# Altium schematic symbol library jlcpcb_2025_04_resistors_extended_0201.schlib: 1508 symbols (part 1 of 8)
Pins are listed as number, name and electrical type; pins without a type are passive.

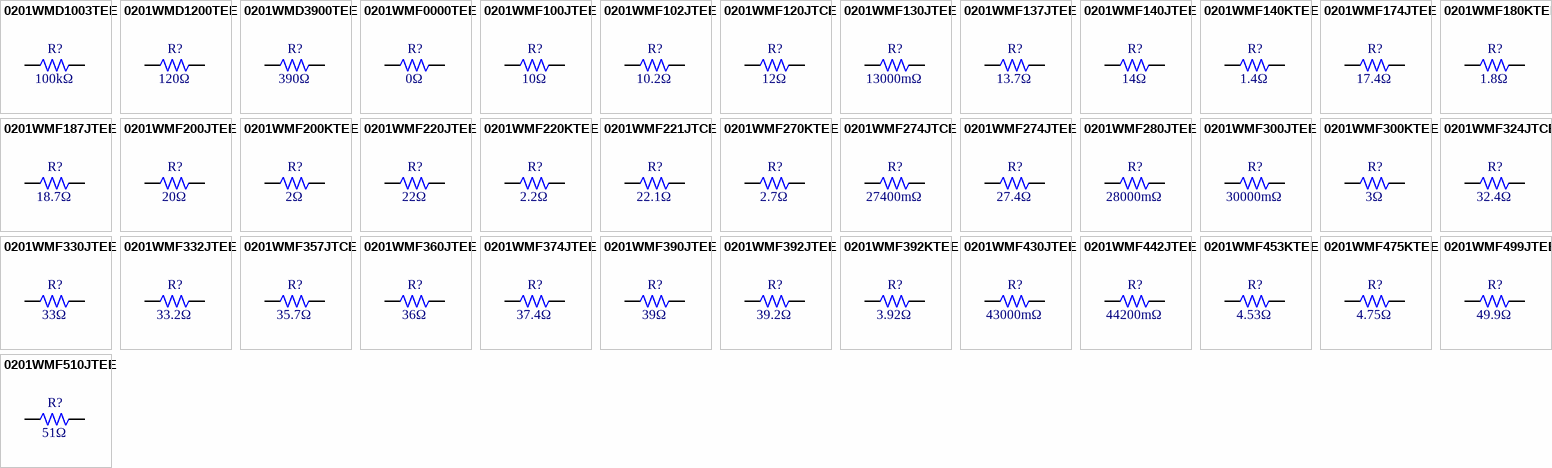
[diagram p0: symbols 0201WMD1003TEE to 0201WMF510JTEE]

## 0201WMD1003TEE
designator R?  Resistance: 100kΩ  (hidden comment: *)
Resistor, 100kΩ, ±0.5%, 50mW, 25V, -55℃~+155℃, SMD 0201; Manufacturer: Uniroyal; Manufacturer Part Number: 0201WMD1003TEE; Supplier 1: LCSC; Supplier Part Number 1: C778396; JLCPCB Part Number: C778396; Power Rating: 50mW; Category: Resistors; Package Size: 0201; JLCPCB Basic Part: Yes; Tolerance: ±0.5%; Voltage Rating: 25V; Temperature Rating: -55℃~+155℃; ComponentLink1Description: Datasheet; ComponentLink1URL: https://wmsc.lcsc.com/wmsc/upload/file/pdf/v2/lcsc/2205312045_UNI-ROYAL-Uniroyal-Elec-0201WMD1003TEE_C778396.pdf; ComponentLink2Description: JLCPCB Part URL; ComponentLink2URL: https://jlcpcb.com/partdetail/C778396
pins: 1, 2
1 alternate drawing of the same symbol

## 0201WMD1200TEE
designator R?  Resistance: 120Ω  (hidden comment: *)
Resistor, 120Ω, ±0.5%, 50mW, 25V, ±200ppm/℃, -55℃~+155℃, SMD 0201; Manufacturer: Uniroyal; Manufacturer Part Number: 0201WMD1200TEE; Supplier 1: LCSC; Supplier Part Number 1: C474180; JLCPCB Part Number: C474180; Power Rating: 50mW; Category: Resistors; Package Size: 0201; JLCPCB Basic Part: Yes; Tolerance: ±0.5%; Voltage Rating: 25V; Temperature Coefficient: ±200ppm/℃; Temperature Rating: -55℃~+155℃; ComponentLink1Description: Datasheet; ComponentLink1URL: https://wmsc.lcsc.com/wmsc/upload/file/pdf/v2/lcsc/2205312045_UNI-ROYAL-Uniroyal-Elec-0201WMD1200TEE_C474180.pdf; ComponentLink2Description: JLCPCB Part URL; ComponentLink2URL: https://jlcpcb.com/partdetail/C474180
pins: 1, 2
1 alternate drawing of the same symbol

## 0201WMD3900TEE
designator R?  Resistance: 390Ω  (hidden comment: *)
Resistor, 390Ω, ±0.5%, 50mW, 25V, ±200ppm/℃, -55℃~+155℃, SMD 0201; Manufacturer: Uniroyal; Manufacturer Part Number: 0201WMD3900TEE; Supplier 1: LCSC; Supplier Part Number 1: C473926; JLCPCB Part Number: C473926; Power Rating: 50mW; Category: Resistors; Package Size: 0201; JLCPCB Basic Part: Yes; Tolerance: ±0.5%; Voltage Rating: 25V; Temperature Coefficient: ±200ppm/℃; Temperature Rating: -55℃~+155℃; ComponentLink1Description: Datasheet; ComponentLink1URL: https://wmsc.lcsc.com/wmsc/upload/file/pdf/v2/lcsc/2205312130_UNI-ROYAL-Uniroyal-Elec-0201WMD3900TEE_C473926.pdf; ComponentLink2Description: JLCPCB Part URL; ComponentLink2URL: https://jlcpcb.com/partdetail/C473926
pins: 1, 2
1 alternate drawing of the same symbol

## 0201WMF0000TEE
designator R?  Resistance: 0Ω  (hidden comment: *)
Resistor, 0Ω, ±1%, 50mW, 25V, -55℃~+155℃, SMD 0201; Manufacturer: Uniroyal; Manufacturer Part Number: 0201WMF0000TEE; Supplier 1: LCSC; Supplier Part Number 1: C473473; JLCPCB Part Number: C473473; Power Rating: 50mW; Category: Resistors; Package Size: 0201; JLCPCB Basic Part: Yes; Tolerance: ±1%; Voltage Rating: 25V; Temperature Rating: -55℃~+155℃; ComponentLink1Description: Datasheet; ComponentLink1URL: https://wmsc.lcsc.com/wmsc/upload/file/pdf/v2/lcsc/2205312145_UNI-ROYAL-Uniroyal-Elec-0201WMF0000TEE_C473473.pdf; ComponentLink2Description: JLCPCB Part URL; ComponentLink2URL: https://jlcpcb.com/partdetail/C473473
pins: 1, 2
1 alternate drawing of the same symbol

## 0201WMF100JTEE
designator R?  Resistance: 10Ω  (hidden comment: *)
Resistor, 10Ω, ±1%, 50mW, 25V, ±200ppm/℃, -55℃~+155℃, SMD 0201; Manufacturer: Uniroyal; Manufacturer Part Number: 0201WMF100JTEE; Supplier 1: LCSC; Supplier Part Number 1: C270817; JLCPCB Part Number: C270817; Power Rating: 50mW; Category: Resistors; Package Size: 0201; JLCPCB Basic Part: Yes; Tolerance: ±1%; Voltage Rating: 25V; Temperature Coefficient: ±200ppm/℃; Temperature Rating: -55℃~+155℃; ComponentLink1Description: Datasheet; ComponentLink1URL: https://wmsc.lcsc.com/wmsc/upload/file/pdf/v2/lcsc/2205312300_UNI-ROYAL-Uniroyal-Elec-0201WMF100JTEE_C270817.pdf; ComponentLink2Description: JLCPCB Part URL; ComponentLink2URL: https://jlcpcb.com/partdetail/C270817
pins: 1, 2
1 alternate drawing of the same symbol

## 0201WMF102JTEE
designator R?  Resistance: 10.2Ω  (hidden comment: *)
Resistor, 10.2Ω, ±1%, 50mW, 25V, ±200ppm/℃, -55℃~+155℃, SMD 0201; Manufacturer: Uniroyal; Manufacturer Part Number: 0201WMF102JTEE; Supplier 1: LCSC; Supplier Part Number 1: C423792; JLCPCB Part Number: C423792; Power Rating: 50mW; Category: Resistors; Package Size: 0201; JLCPCB Basic Part: Yes; Tolerance: ±1%; Voltage Rating: 25V; Temperature Coefficient: ±200ppm/℃; Temperature Rating: -55℃~+155℃; ComponentLink1Description: Datasheet; ComponentLink1URL: https://wmsc.lcsc.com/wmsc/upload/file/pdf/v2/lcsc/2205312145_UNI-ROYAL-Uniroyal-Elec-0201WMF102JTEE_C423792.pdf; ComponentLink2Description: JLCPCB Part URL; ComponentLink2URL: https://jlcpcb.com/partdetail/C423792
pins: 1, 2
1 alternate drawing of the same symbol

## 0201WMF120JTCE
designator R?  Resistance: 12Ω  (hidden comment: *)
Resistor, 12Ω, ±1%, 50mW, 25V, ±200ppm/℃, -55℃~+155℃, SMD 0201; Manufacturer: Uniroyal; Manufacturer Part Number: 0201WMF120JTCE; Supplier 1: LCSC; Supplier Part Number 1: C270807; JLCPCB Part Number: C270807; Power Rating: 50mW; Category: Resistors; Package Size: 0201; JLCPCB Basic Part: Yes; Tolerance: ±1%; Voltage Rating: 25V; Temperature Coefficient: ±200ppm/℃; Temperature Rating: -55℃~+155℃; ComponentLink1Description: Datasheet; ComponentLink1URL: https://wmsc.lcsc.com/wmsc/upload/file/pdf/v2/lcsc/2205312300_UNI-ROYAL-Uniroyal-Elec-0201WMF120JTCE_C270807.pdf; ComponentLink2Description: JLCPCB Part URL; ComponentLink2URL: https://jlcpcb.com/partdetail/C270807
pins: 1, 2
1 alternate drawing of the same symbol

## 0201WMF130JTEE
designator R?  Resistance: 13000mΩ  (hidden comment: *)
Resistor, 13000mΩ, ±1%, 50mW, 25V, ±200ppm/℃, -55℃~+155℃, SMD 0201; Manufacturer: Uniroyal; Manufacturer Part Number: 0201WMF130JTEE; Supplier 1: LCSC; Supplier Part Number 1: C423752; JLCPCB Part Number: C423752; Power Rating: 50mW; Category: Resistors; Package Size: 0201; JLCPCB Basic Part: Yes; Tolerance: ±1%; Voltage Rating: 25V; Temperature Coefficient: ±200ppm/℃; Temperature Rating: -55℃~+155℃; ComponentLink1Description: Datasheet; ComponentLink1URL: https://wmsc.lcsc.com/wmsc/upload/file/pdf/v2/lcsc/2205312145_UNI-ROYAL-Uniroyal-Elec-0201WMF130JTEE_C423752.pdf; ComponentLink2Description: JLCPCB Part URL; ComponentLink2URL: https://jlcpcb.com/partdetail/C423752
pins: 1, 2
1 alternate drawing of the same symbol

## 0201WMF137JTEE
designator R?  Resistance: 13.7Ω  (hidden comment: *)
Resistor, 13.7Ω, ±1%, 50mW, 25V, ±200ppm/℃, -55℃~+155℃, SMD 0201; Manufacturer: Uniroyal; Manufacturer Part Number: 0201WMF137JTEE; Supplier 1: LCSC; Supplier Part Number 1: C423742; JLCPCB Part Number: C423742; Power Rating: 50mW; Category: Resistors; Package Size: 0201; JLCPCB Basic Part: Yes; Tolerance: ±1%; Voltage Rating: 25V; Temperature Coefficient: ±200ppm/℃; Temperature Rating: -55℃~+155℃; ComponentLink1Description: Datasheet; ComponentLink1URL: https://wmsc.lcsc.com/wmsc/upload/file/pdf/v2/lcsc/2205312145_UNI-ROYAL-Uniroyal-Elec-0201WMF137JTEE_C423742.pdf; ComponentLink2Description: JLCPCB Part URL; ComponentLink2URL: https://jlcpcb.com/partdetail/C423742
pins: 1, 2
1 alternate drawing of the same symbol

## 0201WMF140JTEE
designator R?  Resistance: 14Ω  (hidden comment: *)
Resistor, 14Ω, ±1%, 50mW, 25V, ±200ppm/℃, -55℃~+155℃, SMD 0201; Manufacturer: Uniroyal; Manufacturer Part Number: 0201WMF140JTEE; Supplier 1: LCSC; Supplier Part Number 1: C423736; JLCPCB Part Number: C423736; Power Rating: 50mW; Category: Resistors; Package Size: 0201; JLCPCB Basic Part: Yes; Tolerance: ±1%; Voltage Rating: 25V; Temperature Coefficient: ±200ppm/℃; Temperature Rating: -55℃~+155℃; ComponentLink1Description: Datasheet; ComponentLink1URL: https://wmsc.lcsc.com/wmsc/upload/file/pdf/v2/lcsc/2205312145_UNI-ROYAL-Uniroyal-Elec-0201WMF140JTEE_C423736.pdf; ComponentLink2Description: JLCPCB Part URL; ComponentLink2URL: https://jlcpcb.com/partdetail/C423736
pins: 1, 2
1 alternate drawing of the same symbol

## 0201WMF140KTEE
designator R?  Resistance: 1.4Ω  (hidden comment: *)
Resistor, 1.4Ω, ±1%, 50mW, 25V, -100ppm/℃~+350ppm/℃, -55℃~+155℃, SMD 0201; Manufacturer: Uniroyal; Manufacturer Part Number: 0201WMF140KTEE; Supplier 1: LCSC; Supplier Part Number 1: C423735; JLCPCB Part Number: C423735; Power Rating: 50mW; Category: Resistors; Package Size: 0201; JLCPCB Basic Part: Yes; Tolerance: ±1%; Voltage Rating: 25V; Temperature Coefficient: -100ppm/℃~+350ppm/℃; Temperature Rating: -55℃~+155℃; ComponentLink1Description: Datasheet; ComponentLink1URL: https://wmsc.lcsc.com/wmsc/upload/file/pdf/v2/lcsc/2205312145_UNI-ROYAL-Uniroyal-Elec-0201WMF140KTEE_C423735.pdf; ComponentLink2Description: JLCPCB Part URL; ComponentLink2URL: https://jlcpcb.com/partdetail/C423735
pins: 1, 2
1 alternate drawing of the same symbol

## 0201WMF174JTEE
designator R?  Resistance: 17.4Ω  (hidden comment: *)
Resistor, 17.4Ω, ±1%, 50mW, 25V, ±200ppm/℃, -55℃~+155℃, SMD 0201; Manufacturer: Uniroyal; Manufacturer Part Number: 0201WMF174JTEE; Supplier 1: LCSC; Supplier Part Number 1: C423694; JLCPCB Part Number: C423694; Power Rating: 50mW; Category: Resistors; Package Size: 0201; JLCPCB Basic Part: Yes; Tolerance: ±1%; Voltage Rating: 25V; Temperature Coefficient: ±200ppm/℃; Temperature Rating: -55℃~+155℃; ComponentLink1Description: Datasheet; ComponentLink1URL: https://wmsc.lcsc.com/wmsc/upload/file/pdf/v2/lcsc/2205312030_UNI-ROYAL-Uniroyal-Elec-0201WMF174JTEE_C423694.pdf; ComponentLink2Description: JLCPCB Part URL; ComponentLink2URL: https://jlcpcb.com/partdetail/C423694
pins: 1, 2
1 alternate drawing of the same symbol

## 0201WMF180KTEE
designator R?  Resistance: 1.8Ω  (hidden comment: *)
Resistor, 1.8Ω, ±1%, 50mW, 25V, -100ppm/℃~+350ppm/℃, -55℃~+155℃, SMD 0201; Manufacturer: Uniroyal; Manufacturer Part Number: 0201WMF180KTEE; Supplier 1: LCSC; Supplier Part Number 1: C473582; JLCPCB Part Number: C473582; Power Rating: 50mW; Category: Resistors; Package Size: 0201; JLCPCB Basic Part: Yes; Tolerance: ±1%; Voltage Rating: 25V; Temperature Coefficient: -100ppm/℃~+350ppm/℃; Temperature Rating: -55℃~+155℃; ComponentLink1Description: Datasheet; ComponentLink1URL: https://wmsc.lcsc.com/wmsc/upload/file/pdf/v2/lcsc/2205312145_UNI-ROYAL-Uniroyal-Elec-0201WMF180KTEE_C473582.pdf; ComponentLink2Description: JLCPCB Part URL; ComponentLink2URL: https://jlcpcb.com/partdetail/C473582
pins: 1, 2
1 alternate drawing of the same symbol

## 0201WMF187JTEE
designator R?  Resistance: 18.7Ω  (hidden comment: *)
Resistor, 18.7Ω, ±1%, 50mW, 25V, ±200ppm/℃, -55℃~+155℃, SMD 0201; Manufacturer: Uniroyal; Manufacturer Part Number: 0201WMF187JTEE; Supplier 1: LCSC; Supplier Part Number 1: C423680; JLCPCB Part Number: C423680; Power Rating: 50mW; Category: Resistors; Package Size: 0201; JLCPCB Basic Part: Yes; Tolerance: ±1%; Voltage Rating: 25V; Temperature Coefficient: ±200ppm/℃; Temperature Rating: -55℃~+155℃; ComponentLink1Description: Datasheet; ComponentLink1URL: https://wmsc.lcsc.com/wmsc/upload/file/pdf/v2/lcsc/2205312145_UNI-ROYAL-Uniroyal-Elec-0201WMF187JTEE_C423680.pdf; ComponentLink2Description: JLCPCB Part URL; ComponentLink2URL: https://jlcpcb.com/partdetail/C423680
pins: 1, 2
1 alternate drawing of the same symbol

## 0201WMF200JTEE
designator R?  Resistance: 20Ω  (hidden comment: *)
Resistor, 20Ω, ±1%, 50mW, 25V, ±200ppm/℃, -55℃~+155℃, SMD 0201; Manufacturer: Uniroyal; Manufacturer Part Number: 0201WMF200JTEE; Supplier 1: LCSC; Supplier Part Number 1: C473548; JLCPCB Part Number: C473548; Power Rating: 50mW; Category: Resistors; Package Size: 0201; JLCPCB Basic Part: Yes; Tolerance: ±1%; Voltage Rating: 25V; Temperature Coefficient: ±200ppm/℃; Temperature Rating: -55℃~+155℃; ComponentLink1Description: Datasheet; ComponentLink1URL: https://wmsc.lcsc.com/wmsc/upload/file/pdf/v2/lcsc/2205312145_UNI-ROYAL-Uniroyal-Elec-0201WMF200JTEE_C473548.pdf; ComponentLink2Description: JLCPCB Part URL; ComponentLink2URL: https://jlcpcb.com/partdetail/C473548
pins: 1, 2
1 alternate drawing of the same symbol

## 0201WMF200KTEE
designator R?  Resistance: 2Ω  (hidden comment: *)
Resistor, 2Ω, ±1%, 50mW, 25V, -100ppm/℃~+350ppm/℃, -55℃~+155℃, SMD 0201; Manufacturer: Uniroyal; Manufacturer Part Number: 0201WMF200KTEE; Supplier 1: LCSC; Supplier Part Number 1: C474232; JLCPCB Part Number: C474232; Power Rating: 50mW; Category: Resistors; Package Size: 0201; JLCPCB Basic Part: Yes; Tolerance: ±1%; Voltage Rating: 25V; Temperature Coefficient: -100ppm/℃~+350ppm/℃; Temperature Rating: -55℃~+155℃; ComponentLink1Description: Datasheet; ComponentLink1URL: https://wmsc.lcsc.com/wmsc/upload/file/pdf/v2/lcsc/2205312045_UNI-ROYAL-Uniroyal-Elec-0201WMF200KTEE_C474232.pdf; ComponentLink2Description: JLCPCB Part URL; ComponentLink2URL: https://jlcpcb.com/partdetail/C474232
pins: 1, 2
1 alternate drawing of the same symbol

## 0201WMF220JTEE
designator R?  Resistance: 22Ω  (hidden comment: *)
Resistor, 22Ω, ±1%, 50mW, 25V, ±200ppm/℃, -55℃~+155℃, SMD 0201; Manufacturer: Uniroyal; Manufacturer Part Number: 0201WMF220JTEE; Supplier 1: LCSC; Supplier Part Number 1: C270355; JLCPCB Part Number: C270355; Power Rating: 50mW; Category: Resistors; Package Size: 0201; JLCPCB Basic Part: Yes; Tolerance: ±1%; Voltage Rating: 25V; Temperature Coefficient: ±200ppm/℃; Temperature Rating: -55℃~+155℃; ComponentLink1Description: Datasheet; ComponentLink1URL: https://wmsc.lcsc.com/wmsc/upload/file/pdf/v2/lcsc/2205311945_UNI-ROYAL-Uniroyal-Elec-0201WMF220JTEE_C270355.pdf; ComponentLink2Description: JLCPCB Part URL; ComponentLink2URL: https://jlcpcb.com/partdetail/C270355
pins: 1, 2
1 alternate drawing of the same symbol

## 0201WMF220KTEE
designator R?  Resistance: 2.2Ω  (hidden comment: *)
Resistor, 2.2Ω, ±1%, 50mW, 25V, -100ppm/℃~+350ppm/℃, -55℃~+155℃, SMD 0201; Manufacturer: Uniroyal; Manufacturer Part Number: 0201WMF220KTEE; Supplier 1: LCSC; Supplier Part Number 1: C473517; JLCPCB Part Number: C473517; Power Rating: 50mW; Category: Resistors; Package Size: 0201; JLCPCB Basic Part: Yes; Tolerance: ±1%; Voltage Rating: 25V; Temperature Coefficient: -100ppm/℃~+350ppm/℃; Temperature Rating: -55℃~+155℃; ComponentLink1Description: Datasheet; ComponentLink1URL: https://wmsc.lcsc.com/wmsc/upload/file/pdf/v2/lcsc/2205312145_UNI-ROYAL-Uniroyal-Elec-0201WMF220KTEE_C473517.pdf; ComponentLink2Description: JLCPCB Part URL; ComponentLink2URL: https://jlcpcb.com/partdetail/C473517
pins: 1, 2
1 alternate drawing of the same symbol

## 0201WMF221JTCE
designator R?  Resistance: 22.1Ω  (hidden comment: *)
Resistor, 22.1Ω, ±1%, 50mW, 25V, ±200ppm/℃, -55℃~+155℃, SMD 0201; Manufacturer: Uniroyal; Manufacturer Part Number: 0201WMF221JTCE; Supplier 1: LCSC; Supplier Part Number 1: C407773; JLCPCB Part Number: C407773; Power Rating: 50mW; Category: Resistors; Package Size: 0201; JLCPCB Basic Part: Yes; Tolerance: ±1%; Voltage Rating: 25V; Temperature Coefficient: ±200ppm/℃; Temperature Rating: -55℃~+155℃; ComponentLink1Description: Datasheet; ComponentLink1URL: https://wmsc.lcsc.com/wmsc/upload/file/pdf/v2/lcsc/2205312245_UNI-ROYAL-Uniroyal-Elec-0201WMF221JTCE_C407773.pdf; ComponentLink2Description: JLCPCB Part URL; ComponentLink2URL: https://jlcpcb.com/partdetail/C407773
pins: 1, 2
1 alternate drawing of the same symbol

## 0201WMF270KTEE
designator R?  Resistance: 2.7Ω  (hidden comment: *)
Resistor, 2.7Ω, ±1%, 50mW, 25V, -100ppm/℃~+350ppm/℃, -55℃~+155℃, SMD 0201; Manufacturer: Uniroyal; Manufacturer Part Number: 0201WMF270KTEE; Supplier 1: LCSC; Supplier Part Number 1: C423623; JLCPCB Part Number: C423623; Power Rating: 50mW; Category: Resistors; Package Size: 0201; JLCPCB Basic Part: Yes; Tolerance: ±1%; Voltage Rating: 25V; Temperature Coefficient: -100ppm/℃~+350ppm/℃; Temperature Rating: -55℃~+155℃; ComponentLink1Description: Datasheet; ComponentLink1URL: https://wmsc.lcsc.com/wmsc/upload/file/pdf/v2/lcsc/2205312145_UNI-ROYAL-Uniroyal-Elec-0201WMF270KTEE_C423623.pdf; ComponentLink2Description: JLCPCB Part URL; ComponentLink2URL: https://jlcpcb.com/partdetail/C423623
pins: 1, 2
1 alternate drawing of the same symbol

## 0201WMF274JTCE
designator R?  Resistance: 27400mΩ  (hidden comment: *)
Resistor, 27400mΩ, ±1%, 50mW, 25V, ±200ppm/℃, -55℃~+155℃, SMD 0201; Manufacturer: Uniroyal; Manufacturer Part Number: 0201WMF274JTCE; Supplier 1: LCSC; Supplier Part Number 1: C246949; JLCPCB Part Number: C246949; Power Rating: 50mW; Category: Resistors; Package Size: 0201; JLCPCB Basic Part: Yes; Tolerance: ±1%; Voltage Rating: 25V; Temperature Coefficient: ±200ppm/℃; Temperature Rating: -55℃~+155℃; ComponentLink1Description: Datasheet; ComponentLink1URL: https://wmsc.lcsc.com/wmsc/upload/file/pdf/v2/lcsc/2205311916_UNI-ROYAL-Uniroyal-Elec-0201WMF274JTCE_C246949.pdf; ComponentLink2Description: JLCPCB Part URL; ComponentLink2URL: https://jlcpcb.com/partdetail/C246949
pins: 1, 2
1 alternate drawing of the same symbol

## 0201WMF274JTEE
designator R?  Resistance: 27.4Ω  (hidden comment: *)
Resistor, 27.4Ω, ±1%, 50mW, 25V, ±200ppm/℃, -55℃~+155℃, SMD 0201; Manufacturer: Uniroyal; Manufacturer Part Number: 0201WMF274JTEE; Supplier 1: LCSC; Supplier Part Number 1: C423620; JLCPCB Part Number: C423620; Power Rating: 50mW; Category: Resistors; Package Size: 0201; JLCPCB Basic Part: Yes; Tolerance: ±1%; Voltage Rating: 25V; Temperature Coefficient: ±200ppm/℃; Temperature Rating: -55℃~+155℃; ComponentLink1Description: Datasheet; ComponentLink1URL: https://wmsc.lcsc.com/wmsc/upload/file/pdf/v2/lcsc/2205312030_UNI-ROYAL-Uniroyal-Elec-0201WMF274JTEE_C423620.pdf; ComponentLink2Description: JLCPCB Part URL; ComponentLink2URL: https://jlcpcb.com/partdetail/C423620
pins: 1, 2
1 alternate drawing of the same symbol

## 0201WMF280JTEE
designator R?  Resistance: 28000mΩ  (hidden comment: *)
Resistor, 28000mΩ, ±1%, 50mW, 25V, ±200ppm/℃, -55℃~+155℃, SMD 0201; Manufacturer: Uniroyal; Manufacturer Part Number: 0201WMF280JTEE; Supplier 1: LCSC; Supplier Part Number 1: C423616; JLCPCB Part Number: C423616; Power Rating: 50mW; Category: Resistors; Package Size: 0201; JLCPCB Basic Part: Yes; Tolerance: ±1%; Voltage Rating: 25V; Temperature Coefficient: ±200ppm/℃; Temperature Rating: -55℃~+155℃; ComponentLink1Description: Datasheet; ComponentLink1URL: https://wmsc.lcsc.com/wmsc/upload/file/pdf/v2/lcsc/2205312145_UNI-ROYAL-Uniroyal-Elec-0201WMF280JTEE_C423616.pdf; ComponentLink2Description: JLCPCB Part URL; ComponentLink2URL: https://jlcpcb.com/partdetail/C423616
pins: 1, 2
1 alternate drawing of the same symbol

## 0201WMF300JTEE
designator R?  Resistance: 30000mΩ  (hidden comment: *)
Resistor, 30000mΩ, ±1%, 50mW, 25V, ±200ppm/℃, -55℃~+155℃, SMD 0201; Manufacturer: Uniroyal; Manufacturer Part Number: 0201WMF300JTEE; Supplier 1: LCSC; Supplier Part Number 1: C423600; JLCPCB Part Number: C423600; Power Rating: 50mW; Category: Resistors; Package Size: 0201; JLCPCB Basic Part: Yes; Tolerance: ±1%; Voltage Rating: 25V; Temperature Coefficient: ±200ppm/℃; Temperature Rating: -55℃~+155℃; ComponentLink1Description: Datasheet; ComponentLink1URL: https://wmsc.lcsc.com/wmsc/upload/file/pdf/v2/lcsc/2205312145_UNI-ROYAL-Uniroyal-Elec-0201WMF300JTEE_C423600.pdf; ComponentLink2Description: JLCPCB Part URL; ComponentLink2URL: https://jlcpcb.com/partdetail/C423600
pins: 1, 2
1 alternate drawing of the same symbol

## 0201WMF300KTEE
designator R?  Resistance: 3Ω  (hidden comment: *)
Resistor, 3Ω, ±1%, 50mW, 25V, -100ppm/℃~+350ppm/℃, -55℃~+155℃, SMD 0201; Manufacturer: Uniroyal; Manufacturer Part Number: 0201WMF300KTEE; Supplier 1: LCSC; Supplier Part Number 1: C423599; JLCPCB Part Number: C423599; Power Rating: 50mW; Category: Resistors; Package Size: 0201; JLCPCB Basic Part: Yes; Tolerance: ±1%; Voltage Rating: 25V; Temperature Coefficient: -100ppm/℃~+350ppm/℃; Temperature Rating: -55℃~+155℃; ComponentLink1Description: Datasheet; ComponentLink1URL: https://wmsc.lcsc.com/wmsc/upload/file/pdf/v2/lcsc/2205312145_UNI-ROYAL-Uniroyal-Elec-0201WMF300KTEE_C423599.pdf; ComponentLink2Description: JLCPCB Part URL; ComponentLink2URL: https://jlcpcb.com/partdetail/C423599
pins: 1, 2
1 alternate drawing of the same symbol

## 0201WMF324JTCE
designator R?  Resistance: 32.4Ω  (hidden comment: *)
Resistor, 32.4Ω, ±1%, 50mW, 25V, ±200ppm/℃, -55℃~+155℃, SMD 0201; Manufacturer: Uniroyal; Manufacturer Part Number: 0201WMF324JTCE; Supplier 1: LCSC; Supplier Part Number 1: C270749; JLCPCB Part Number: C270749; Power Rating: 50mW; Category: Resistors; Package Size: 0201; JLCPCB Basic Part: Yes; Tolerance: ±1%; Voltage Rating: 25V; Temperature Coefficient: ±200ppm/℃; Temperature Rating: -55℃~+155℃; ComponentLink1Description: Datasheet; ComponentLink1URL: https://wmsc.lcsc.com/wmsc/upload/file/pdf/v2/lcsc/2205311945_UNI-ROYAL-Uniroyal-Elec-0201WMF324JTCE_C270749.pdf; ComponentLink2Description: JLCPCB Part URL; ComponentLink2URL: https://jlcpcb.com/partdetail/C270749
pins: 1, 2
1 alternate drawing of the same symbol

## 0201WMF330JTEE
designator R?  Resistance: 33Ω  (hidden comment: *)
Resistor, 33Ω, ±1%, 50mW, 25V, ±200ppm/℃, -55℃~+155℃, SMD 0201; Manufacturer: Uniroyal; Manufacturer Part Number: 0201WMF330JTEE; Supplier 1: LCSC; Supplier Part Number 1: C473457; JLCPCB Part Number: C473457; Power Rating: 50mW; Category: Resistors; Package Size: 0201; JLCPCB Basic Part: Yes; Tolerance: ±1%; Voltage Rating: 25V; Temperature Coefficient: ±200ppm/℃; Temperature Rating: -55℃~+155℃; ComponentLink1Description: Datasheet; ComponentLink1URL: https://wmsc.lcsc.com/wmsc/upload/file/pdf/v2/lcsc/2205312145_UNI-ROYAL-Uniroyal-Elec-0201WMF330JTEE_C473457.pdf; ComponentLink2Description: JLCPCB Part URL; ComponentLink2URL: https://jlcpcb.com/partdetail/C473457
pins: 1, 2
1 alternate drawing of the same symbol

## 0201WMF332JTEE
designator R?  Resistance: 33.2Ω  (hidden comment: *)
Resistor, 33.2Ω, ±1%, 50mW, 25V, ±200ppm/℃, -55℃~+155℃, SMD 0201; Manufacturer: Uniroyal; Manufacturer Part Number: 0201WMF332JTEE; Supplier 1: LCSC; Supplier Part Number 1: C2691506; JLCPCB Part Number: C2691506; Power Rating: 50mW; Category: Resistors; Package Size: 0201; JLCPCB Basic Part: Yes; Tolerance: ±1%; Voltage Rating: 25V; Temperature Coefficient: ±200ppm/℃; Temperature Rating: -55℃~+155℃; ComponentLink1Description: Datasheet; ComponentLink1URL: https://wmsc.lcsc.com/wmsc/upload/file/pdf/v2/lcsc/2206011045_UNI-ROYAL-Uniroyal-Elec-0201WMF332JTEE_C2691506.pdf; ComponentLink2Description: JLCPCB Part URL; ComponentLink2URL: https://jlcpcb.com/partdetail/C2691506
pins: 1, 2
1 alternate drawing of the same symbol

## 0201WMF357JTCE
designator R?  Resistance: 35.7Ω  (hidden comment: *)
Resistor, 35.7Ω, ±1%, 50mW, 25V, ±200ppm/℃, -55℃~+155℃, SMD 0201; Manufacturer: Uniroyal; Manufacturer Part Number: 0201WMF357JTCE; Supplier 1: LCSC; Supplier Part Number 1: C270741; JLCPCB Part Number: C270741; Power Rating: 50mW; Category: Resistors; Package Size: 0201; JLCPCB Basic Part: Yes; Tolerance: ±1%; Voltage Rating: 25V; Temperature Coefficient: ±200ppm/℃; Temperature Rating: -55℃~+155℃; ComponentLink1Description: Datasheet; ComponentLink1URL: https://wmsc.lcsc.com/wmsc/upload/file/pdf/v2/lcsc/2205311945_UNI-ROYAL-Uniroyal-Elec-0201WMF357JTCE_C270741.pdf; ComponentLink2Description: JLCPCB Part URL; ComponentLink2URL: https://jlcpcb.com/partdetail/C270741
pins: 1, 2
1 alternate drawing of the same symbol

## 0201WMF360JTEE
designator R?  Resistance: 36Ω  (hidden comment: *)
Resistor, 36Ω, ±1%, 50mW, 25V, ±200ppm/℃, -55℃~+155℃, SMD 0201; Manufacturer: Uniroyal; Manufacturer Part Number: 0201WMF360JTEE; Supplier 1: LCSC; Supplier Part Number 1: C473052; JLCPCB Part Number: C473052; Power Rating: 50mW; Category: Resistors; Package Size: 0201; JLCPCB Basic Part: Yes; Tolerance: ±1%; Voltage Rating: 25V; Temperature Coefficient: ±200ppm/℃; Temperature Rating: -55℃~+155℃; ComponentLink1Description: Datasheet; ComponentLink1URL: https://wmsc.lcsc.com/wmsc/upload/file/pdf/v2/lcsc/2205312030_UNI-ROYAL-Uniroyal-Elec-0201WMF360JTEE_C473052.pdf; ComponentLink2Description: JLCPCB Part URL; ComponentLink2URL: https://jlcpcb.com/partdetail/C473052
pins: 1, 2
1 alternate drawing of the same symbol

## 0201WMF374JTEE
designator R?  Resistance: 37.4Ω  (hidden comment: *)
Resistor, 37.4Ω, ±1%, 50mW, 25V, ±200ppm/℃, -55℃~+155℃, SMD 0201; Manufacturer: Uniroyal; Manufacturer Part Number: 0201WMF374JTEE; Supplier 1: LCSC; Supplier Part Number 1: C473520; JLCPCB Part Number: C473520; Power Rating: 50mW; Category: Resistors; Package Size: 0201; JLCPCB Basic Part: Yes; Tolerance: ±1%; Voltage Rating: 25V; Temperature Coefficient: ±200ppm/℃; Temperature Rating: -55℃~+155℃; ComponentLink1Description: Datasheet; ComponentLink1URL: https://wmsc.lcsc.com/wmsc/upload/file/pdf/v2/lcsc/2205312145_UNI-ROYAL-Uniroyal-Elec-0201WMF374JTEE_C473520.pdf; ComponentLink2Description: JLCPCB Part URL; ComponentLink2URL: https://jlcpcb.com/partdetail/C473520
pins: 1, 2
1 alternate drawing of the same symbol

## 0201WMF390JTEE
designator R?  Resistance: 39Ω  (hidden comment: *)
Resistor, 39Ω, ±1%, 50mW, 25V, ±200ppm/℃, -55℃~+155℃, SMD 0201; Manufacturer: Uniroyal; Manufacturer Part Number: 0201WMF390JTEE; Supplier 1: LCSC; Supplier Part Number 1: C473431; JLCPCB Part Number: C473431; Power Rating: 50mW; Category: Resistors; Package Size: 0201; JLCPCB Basic Part: Yes; Tolerance: ±1%; Voltage Rating: 25V; Temperature Coefficient: ±200ppm/℃; Temperature Rating: -55℃~+155℃; ComponentLink1Description: Datasheet; ComponentLink1URL: https://wmsc.lcsc.com/wmsc/upload/file/pdf/v2/lcsc/2205312145_UNI-ROYAL-Uniroyal-Elec-0201WMF390JTEE_C473431.pdf; ComponentLink2Description: JLCPCB Part URL; ComponentLink2URL: https://jlcpcb.com/partdetail/C473431
pins: 1, 2
1 alternate drawing of the same symbol

## 0201WMF392JTEE
designator R?  Resistance: 39.2Ω  (hidden comment: *)
Resistor, 39.2Ω, ±1%, 50mW, 25V, -55℃~+155℃, SMD 0201; Manufacturer: Uniroyal; Manufacturer Part Number: 0201WMF392JTEE; Supplier 1: LCSC; Supplier Part Number 1: C423538; JLCPCB Part Number: C423538; Power Rating: 50mW; Category: Resistors; Package Size: 0201; JLCPCB Basic Part: Yes; Tolerance: ±1%; Voltage Rating: 25V; Temperature Rating: -55℃~+155℃; ComponentLink1Description: Datasheet; ComponentLink2Description: JLCPCB Part URL; ComponentLink2URL: https://jlcpcb.com/partdetail/C423538
pins: 1, 2
1 alternate drawing of the same symbol

## 0201WMF392KTEE
designator R?  Resistance: 3.92Ω  (hidden comment: *)
Resistor, 3.92Ω, ±1%, 50mW, 25V, -100ppm/℃~+350ppm/℃, -55℃~+155℃, SMD 0201; Manufacturer: Uniroyal; Manufacturer Part Number: 0201WMF392KTEE; Supplier 1: LCSC; Supplier Part Number 1: C423537; JLCPCB Part Number: C423537; Power Rating: 50mW; Category: Resistors; Package Size: 0201; JLCPCB Basic Part: Yes; Tolerance: ±1%; Voltage Rating: 25V; Temperature Coefficient: -100ppm/℃~+350ppm/℃; Temperature Rating: -55℃~+155℃; ComponentLink1Description: Datasheet; ComponentLink1URL: https://wmsc.lcsc.com/wmsc/upload/file/pdf/v2/lcsc/2205312145_UNI-ROYAL-Uniroyal-Elec-0201WMF392KTEE_C423537.pdf; ComponentLink2Description: JLCPCB Part URL; ComponentLink2URL: https://jlcpcb.com/partdetail/C423537
pins: 1, 2
1 alternate drawing of the same symbol

## 0201WMF430JTEE
designator R?  Resistance: 43000mΩ  (hidden comment: *)
Resistor, 43000mΩ, ±1%, 50mW, 25V, ±200ppm/℃, -55℃~+155℃, SMD 0201; Manufacturer: Uniroyal; Manufacturer Part Number: 0201WMF430JTEE; Supplier 1: LCSC; Supplier Part Number 1: C423522; JLCPCB Part Number: C423522; Power Rating: 50mW; Category: Resistors; Package Size: 0201; JLCPCB Basic Part: Yes; Tolerance: ±1%; Voltage Rating: 25V; Temperature Coefficient: ±200ppm/℃; Temperature Rating: -55℃~+155℃; ComponentLink1Description: Datasheet; ComponentLink1URL: https://wmsc.lcsc.com/wmsc/upload/file/pdf/v2/lcsc/2205312145_UNI-ROYAL-Uniroyal-Elec-0201WMF430JTEE_C423522.pdf; ComponentLink2Description: JLCPCB Part URL; ComponentLink2URL: https://jlcpcb.com/partdetail/C423522
pins: 1, 2
1 alternate drawing of the same symbol

## 0201WMF442JTEE
designator R?  Resistance: 44200mΩ  (hidden comment: *)
Resistor, 44200mΩ, ±1%, 50mW, 25V, ±200ppm/℃, -55℃~+155℃, SMD 0201; Manufacturer: Uniroyal; Manufacturer Part Number: 0201WMF442JTEE; Supplier 1: LCSC; Supplier Part Number 1: C423512; JLCPCB Part Number: C423512; Power Rating: 50mW; Category: Resistors; Package Size: 0201; JLCPCB Basic Part: Yes; Tolerance: ±1%; Voltage Rating: 25V; Temperature Coefficient: ±200ppm/℃; Temperature Rating: -55℃~+155℃; ComponentLink1Description: Datasheet; ComponentLink1URL: https://wmsc.lcsc.com/wmsc/upload/file/pdf/v2/lcsc/2205312145_UNI-ROYAL-Uniroyal-Elec-0201WMF442JTEE_C423512.pdf; ComponentLink2Description: JLCPCB Part URL; ComponentLink2URL: https://jlcpcb.com/partdetail/C423512
pins: 1, 2
1 alternate drawing of the same symbol

## 0201WMF453KTEE
designator R?  Resistance: 4.53Ω  (hidden comment: *)
Resistor, 4.53Ω, ±1%, 50mW, 25V, -100ppm/℃~+350ppm/℃, -55℃~+155℃, SMD 0201; Manufacturer: Uniroyal; Manufacturer Part Number: 0201WMF453KTEE; Supplier 1: LCSC; Supplier Part Number 1: C423508; JLCPCB Part Number: C423508; Power Rating: 50mW; Category: Resistors; Package Size: 0201; JLCPCB Basic Part: Yes; Tolerance: ±1%; Voltage Rating: 25V; Temperature Coefficient: -100ppm/℃~+350ppm/℃; Temperature Rating: -55℃~+155℃; ComponentLink1Description: Datasheet; ComponentLink1URL: https://wmsc.lcsc.com/wmsc/upload/file/pdf/v2/lcsc/2205312030_UNI-ROYAL-Uniroyal-Elec-0201WMF453KTEE_C423508.pdf; ComponentLink2Description: JLCPCB Part URL; ComponentLink2URL: https://jlcpcb.com/partdetail/C423508
pins: 1, 2
1 alternate drawing of the same symbol

## 0201WMF475KTEE
designator R?  Resistance: 4.75Ω  (hidden comment: *)
Resistor, 4.75Ω, ±1%, 50mW, 25V, -100ppm/℃~+350ppm/℃, -55℃~+155℃, SMD 0201; Manufacturer: Uniroyal; Manufacturer Part Number: 0201WMF475KTEE; Supplier 1: LCSC; Supplier Part Number 1: C423503; JLCPCB Part Number: C423503; Power Rating: 50mW; Category: Resistors; Package Size: 0201; JLCPCB Basic Part: Yes; Tolerance: ±1%; Voltage Rating: 25V; Temperature Coefficient: -100ppm/℃~+350ppm/℃; Temperature Rating: -55℃~+155℃; ComponentLink1Description: Datasheet; ComponentLink1URL: https://wmsc.lcsc.com/wmsc/upload/file/pdf/v2/lcsc/2205312145_UNI-ROYAL-Uniroyal-Elec-0201WMF475KTEE_C423503.pdf; ComponentLink2Description: JLCPCB Part URL; ComponentLink2URL: https://jlcpcb.com/partdetail/C423503
pins: 1, 2
1 alternate drawing of the same symbol

## 0201WMF499JTEE
designator R?  Resistance: 49.9Ω  (hidden comment: *)
Resistor, 49.9Ω, ±1%, 50mW, 25V, ±200ppm/℃, -55℃~+155℃, SMD 0201; Manufacturer: Uniroyal; Manufacturer Part Number: 0201WMF499JTEE; Supplier 1: LCSC; Supplier Part Number 1: C620444; JLCPCB Part Number: C620444; Power Rating: 50mW; Category: Resistors; Package Size: 0201; JLCPCB Basic Part: Yes; Tolerance: ±1%; Voltage Rating: 25V; Temperature Coefficient: ±200ppm/℃; Temperature Rating: -55℃~+155℃; ComponentLink1Description: Datasheet; ComponentLink1URL: https://wmsc.lcsc.com/wmsc/upload/file/pdf/v2/lcsc/2205311816_UNI-ROYAL-Uniroyal-Elec-0201WMF499JTEE_C620444.pdf; ComponentLink2Description: JLCPCB Part URL; ComponentLink2URL: https://jlcpcb.com/partdetail/C620444
pins: 1, 2
1 alternate drawing of the same symbol

## 0201WMF510JTEE
designator R?  Resistance: 51Ω  (hidden comment: *)
Resistor, 51Ω, ±1%, 50mW, 25V, ±200ppm/℃, -55℃~+155℃, SMD 0201; Manufacturer: Uniroyal; Manufacturer Part Number: 0201WMF510JTEE; Supplier 1: LCSC; Supplier Part Number 1: C270343; JLCPCB Part Number: C270343; Power Rating: 50mW; Category: Resistors; Package Size: 0201; JLCPCB Basic Part: Yes; Tolerance: ±1%; Voltage Rating: 25V; Temperature Coefficient: ±200ppm/℃; Temperature Rating: -55℃~+155℃; ComponentLink1Description: Datasheet; ComponentLink1URL: https://wmsc.lcsc.com/wmsc/upload/file/pdf/v2/lcsc/2205311945_UNI-ROYAL-Uniroyal-Elec-0201WMF510JTEE_C270343.pdf; ComponentLink2Description: JLCPCB Part URL; ComponentLink2URL: https://jlcpcb.com/partdetail/C270343
pins: 1, 2
1 alternate drawing of the same symbol

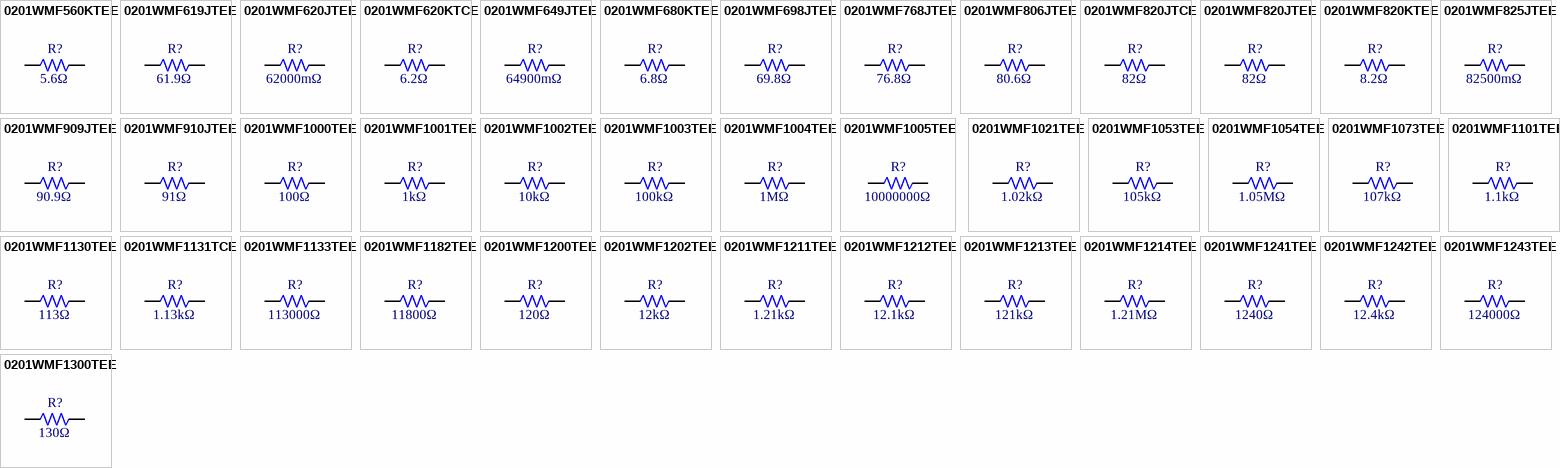
[diagram p1: symbols 0201WMF560KTEE to 0201WMF1300TEE]

## 0201WMF560KTEE
designator R?  Resistance: 5.6Ω  (hidden comment: *)
Resistor, 5.6Ω, ±1%, 50mW, 25V, -100ppm/℃~+350ppm/℃, -55℃~+155℃, SMD 0201; Manufacturer: Uniroyal; Manufacturer Part Number: 0201WMF560KTEE; Supplier 1: LCSC; Supplier Part Number 1: C473652; JLCPCB Part Number: C473652; Power Rating: 50mW; Category: Resistors; Package Size: 0201; JLCPCB Basic Part: Yes; Tolerance: ±1%; Voltage Rating: 25V; Temperature Coefficient: -100ppm/℃~+350ppm/℃; Temperature Rating: -55℃~+155℃; ComponentLink1Description: Datasheet; ComponentLink1URL: https://wmsc.lcsc.com/wmsc/upload/file/pdf/v2/lcsc/2205312130_UNI-ROYAL-Uniroyal-Elec-0201WMF560KTEE_C473652.pdf; ComponentLink2Description: JLCPCB Part URL; ComponentLink2URL: https://jlcpcb.com/partdetail/C473652
pins: 1, 2
1 alternate drawing of the same symbol

## 0201WMF619JTEE
designator R?  Resistance: 61.9Ω  (hidden comment: *)
Resistor, 61.9Ω, ±1%, 50mW, 25V, -55℃~+155℃, SMD 0201; Manufacturer: Uniroyal; Manufacturer Part Number: 0201WMF619JTEE; Supplier 1: LCSC; Supplier Part Number 1: C423466; JLCPCB Part Number: C423466; Power Rating: 50mW; Category: Resistors; Package Size: 0201; JLCPCB Basic Part: Yes; Tolerance: ±1%; Voltage Rating: 25V; Temperature Rating: -55℃~+155℃; ComponentLink1Description: Datasheet; ComponentLink1URL: https://wmsc.lcsc.com/wmsc/upload/file/pdf/v2/lcsc/2306071622_UNI-ROYAL-Uniroyal-Elec-0201WMF619JTEE_C423466.pdf; ComponentLink2Description: JLCPCB Part URL; ComponentLink2URL: https://jlcpcb.com/partdetail/C423466
pins: 1, 2
1 alternate drawing of the same symbol

## 0201WMF620JTEE
designator R?  Resistance: 62000mΩ  (hidden comment: *)
Resistor, 62000mΩ, ±1%, 50mW, 25V, ±200ppm/℃, -55℃~+155℃, SMD 0201; Manufacturer: Uniroyal; Manufacturer Part Number: 0201WMF620JTEE; Supplier 1: LCSC; Supplier Part Number 1: C423461; JLCPCB Part Number: C423461; Power Rating: 50mW; Category: Resistors; Package Size: 0201; JLCPCB Basic Part: Yes; Tolerance: ±1%; Voltage Rating: 25V; Temperature Coefficient: ±200ppm/℃; Temperature Rating: -55℃~+155℃; ComponentLink1Description: Datasheet; ComponentLink1URL: https://wmsc.lcsc.com/wmsc/upload/file/pdf/v2/lcsc/2206011100_UNI-ROYAL-Uniroyal-Elec-0201WMF620JTEE_C423461.pdf; ComponentLink2Description: JLCPCB Part URL; ComponentLink2URL: https://jlcpcb.com/partdetail/C423461
pins: 1, 2
1 alternate drawing of the same symbol

## 0201WMF620KTCE
designator R?  Resistance: 6.2Ω  (hidden comment: *)
Resistor, 6.2Ω, ±1%, 50mW, 25V, ±400ppm/℃, -55℃~+155℃, SMD 0201; Manufacturer: Uniroyal; Manufacturer Part Number: 0201WMF620KTCE; Supplier 1: LCSC; Supplier Part Number 1: C270703; JLCPCB Part Number: C270703; Power Rating: 50mW; Category: Resistors; Package Size: 0201; JLCPCB Basic Part: Yes; Tolerance: ±1%; Voltage Rating: 25V; Temperature Coefficient: ±400ppm/℃; Temperature Rating: -55℃~+155℃; ComponentLink1Description: Datasheet; ComponentLink1URL: https://wmsc.lcsc.com/wmsc/upload/file/pdf/v2/lcsc/2205311945_UNI-ROYAL-Uniroyal-Elec-0201WMF620KTCE_C270703.pdf; ComponentLink2Description: JLCPCB Part URL; ComponentLink2URL: https://jlcpcb.com/partdetail/C270703
pins: 1, 2
1 alternate drawing of the same symbol

## 0201WMF649JTEE
designator R?  Resistance: 64900mΩ  (hidden comment: *)
Resistor, 64900mΩ, ±1%, 50mW, 25V, ±200ppm/℃, -55℃~+155℃, SMD 0201; Manufacturer: Uniroyal; Manufacturer Part Number: 0201WMF649JTEE; Supplier 1: LCSC; Supplier Part Number 1: C423454; JLCPCB Part Number: C423454; Power Rating: 50mW; Category: Resistors; Package Size: 0201; JLCPCB Basic Part: Yes; Tolerance: ±1%; Voltage Rating: 25V; Temperature Coefficient: ±200ppm/℃; Temperature Rating: -55℃~+155℃; ComponentLink1Description: Datasheet; ComponentLink1URL: https://wmsc.lcsc.com/wmsc/upload/file/pdf/v2/lcsc/2205312145_UNI-ROYAL-Uniroyal-Elec-0201WMF649JTEE_C423454.pdf; ComponentLink2Description: JLCPCB Part URL; ComponentLink2URL: https://jlcpcb.com/partdetail/C423454
pins: 1, 2
1 alternate drawing of the same symbol
